# Altium footprint library MH_DA_THU_VIEN_16122016.PcbLib: 531 footprints (part 6 of 34)
Each footprint in its own frame and in the unit in brackets; x right, y up, seen from the top. Pads: shape width x height; smd on the part's side, far side on the other; paste and mask are expansions set on the pad; w line width, h text height; cw(c..) or ccw(c..) is an arc to the next point about the centre after c.
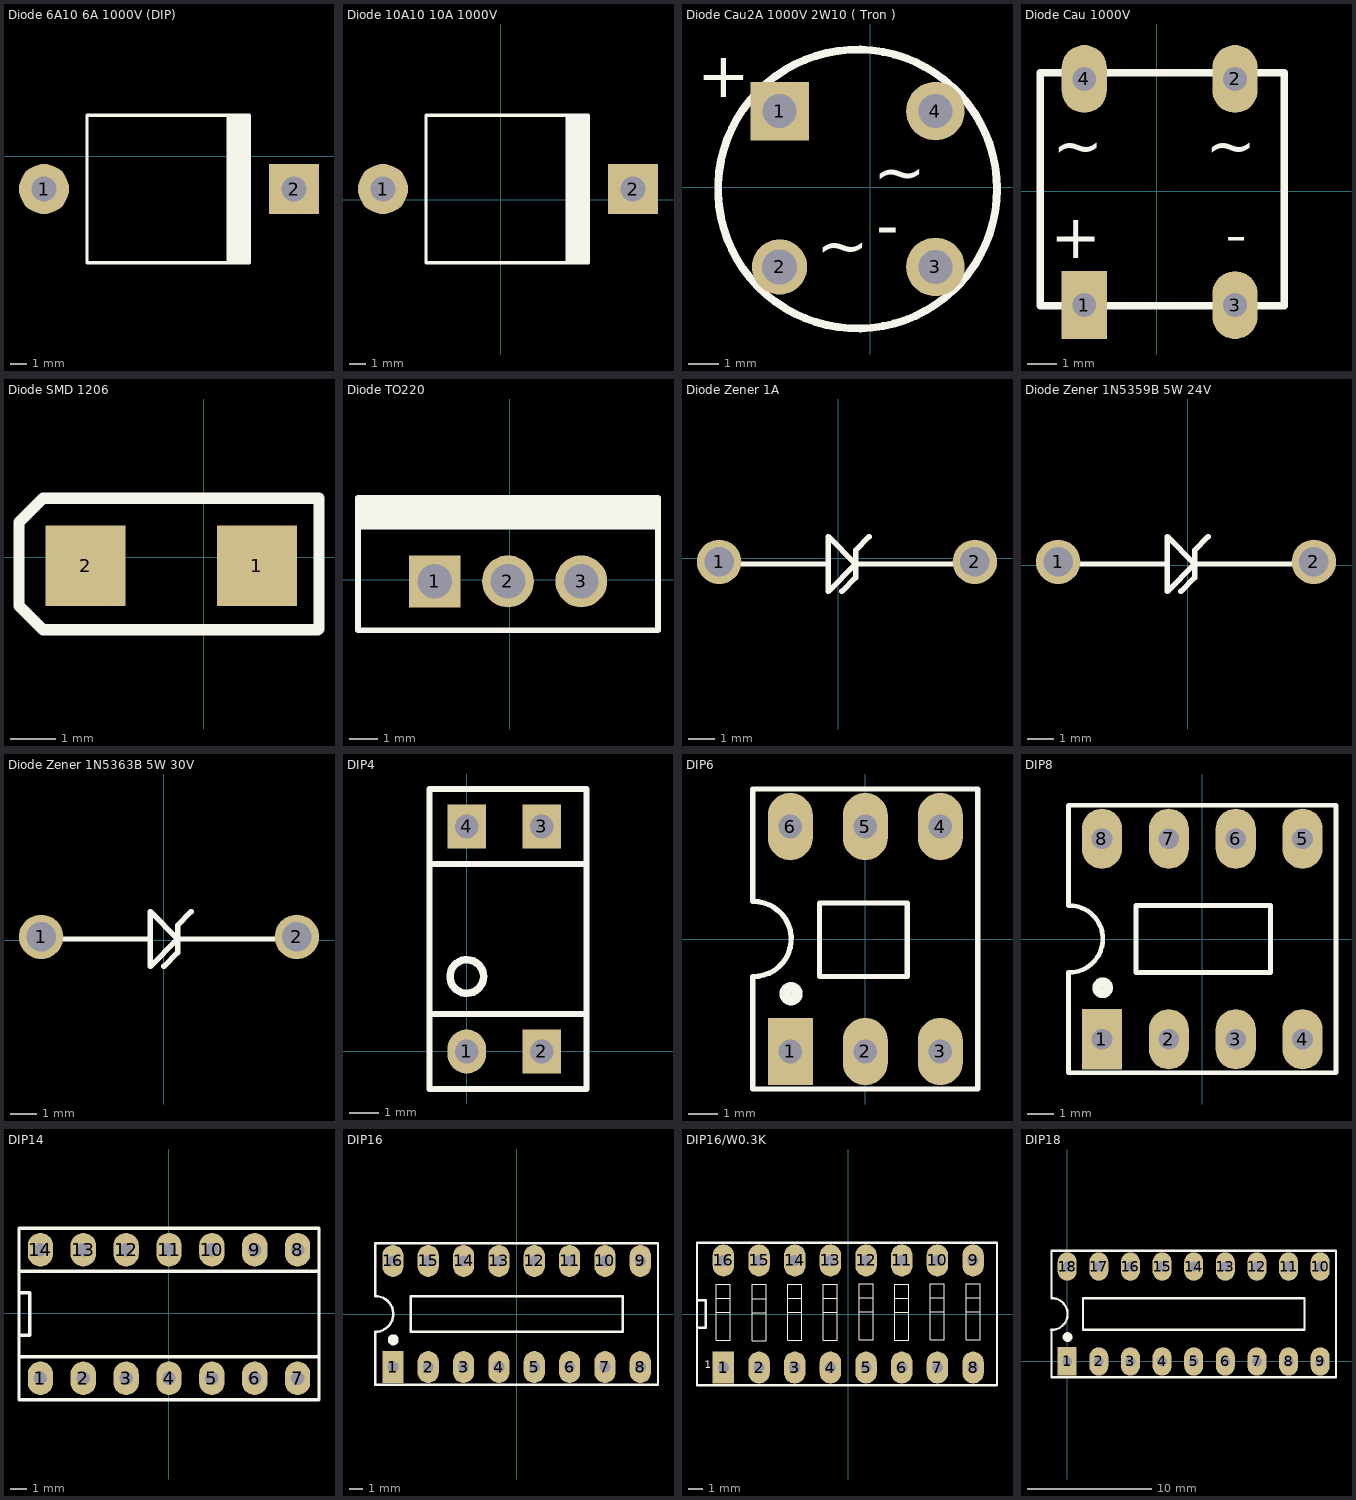
[diagram p5: the footprints below, top view; thin cyan lines are the x and y axes]

## Diode 6A10 6A 1000V (DIP) [mil]
pads (2):
  round 120 hole 60: 1(252.2,-79.02)
  rect 120x120 hole 60: 2(852.2,-79.02)
Top Overlay:
  rectangle: 690,-256.18 749.06,98.15
  lines w7.87: 745.2,-256.18 355.35,-256.18 355.35,98.15 745.2,98.15
3D body: height 179.53, standoff -399.61, extent 229.41,-264.52 880.59,94.53

## Diode 10A10 10A 1000V [mil]
pads (2):
  round 120 hole 60: 1(-282.8,25.98)
  rect 120x120 hole 60: 2(317.2,25.98)
Top Overlay:
  rectangle: 155,-151.18 214.06,203.15
  lines w7.87: 210.2,-151.18 -179.65,-151.18 -179.65,203.15 210.2,203.15
3D body: height 179.53, standoff -399.61, extent -310.6,-154.53 340.58,204.53

## Diode Cau2A 1000V 2W10 ( Tron ) [mm]
pads (4):
  rect 1.905x1.905 hole 1.1: 1(-2.952,2.477)
  round 1.8 hole 1.143: 2(-2.952,-2.603)
  round 1.905 hole 1.1: 3(2.128,-2.603) 4(2.128,2.477)
Top Overlay:
  circle w0.254: c-0.412,-0.063 r4.547
  text "+" at -5.644,2.934 h1.5
  text "-" at 0.198,-1.968 h1.5
  text "~" at -1.758,-2.628 h1.5
  text "~" at 0.096,-0.241 h1.5

## Diode Cau 1000V [mil]
pads (4):
  rect 60x90 hole 31.5: 1(-96.44,-151.02)
  oval 60x90 hole 31.5: 2(103.56,148.98) 3(103.56,-151.02) 4(-96.44,148.98)
Top Overlay:
  lines w10: -155,-151.98 -155,157.02 169,157.02 169,-151.98 -155,-151.98
  text "-" at 120,-23.98 h100
  text "+" at -74,-18.98 h100
  text "~" at -71,102.02 h100
  text "~" at 132,102.02 h100
3D body: height 146, standoff -122.11, extent -158.28,-154.92 164.56,156.89

## Diode SMD 1206 [mil]
pads (2):
  rect 70x70 smd: 1(46.38,-7.48) 2(-103.23,-7.48)
Top Overlay:
  lines w10: -161.43,-42.48 -140.43,-63.48 -139.43,-63.48 99.57,-63.48 100.57,-62.48 100.57,51.52 -134.43,51.52 -140.43,51.52 -161.43,30.52 -161.43,-42.48
3D body: height 62.99, standoff 0, extent -101.26,-41.48 44.41,21.52

## Diode TO220 [mm]
pads (3):
  rect 1.8x1.8 hole 1.2: 1(-2.595,-0.047)
  round 1.8 hole 1.2: 2(-0.055,-0.047) 3(2.485,-0.047)
Top Overlay:
  rectangle: -5.255,1.845 5.145,2.853
  lines w0.2: -5.255,1.845 5.145,1.845 ; -5.255,-1.747 5.145,-1.747 5.145,2.853 -5.255,2.853 -5.255,-1.747
3D body: height 8.08, standoff -20.7, extent -4.94,-1.919 4.96,2.581

## Diode Zener 1A [mil]
pads (2):
  round 65 hole 43.31: 1(-175,-5) 2(200,-5)
Top Overlay:
  lines w8: -170,-8.11 -14.96,-8.11 ; 5.04,-48.11 25.04,-28.11 25.04,-8.11 ; 45.04,31.89 25.04,11.89 25.04,-8.11 ; 190,-8.11 25.04,-8.11 ; 25.04,-8.11 -14.96,31.89 -14.96,-48.11 25.04,-8.11
3D body: height 84.5, standoff -100, extent -195.49,-39 225.49,30

## Diode Zener 1N5359B 5W 24V [mil]
pads (2):
  round 65 hole 43.31: 1(-190,5) 2(185,5)
Top Overlay:
  lines w8: -185,1.89 -29.96,1.89 ; -9.96,-38.11 10.04,-18.11 10.04,1.89 ; 30.04,41.89 10.04,21.89 10.04,1.89 ; 175,1.89 10.04,1.89 ; 10.04,1.89 -29.96,41.89 -29.96,-38.11 10.04,1.89
3D body: height 84.5, standoff -100, extent -210.49,-29 210.49,40

## Diode Zener 1N5363B 5W 30V [mil]
pads (2):
  round 65 hole 43.31: 1(-180,5) 2(195,5)
Top Overlay:
  lines w8: -175,1.89 -19.96,1.89 ; 0.04,-38.11 20.04,-18.11 20.04,1.89 ; 40.04,41.89 20.04,21.89 20.04,1.89 ; 185,1.89 20.04,1.89 ; 20.04,1.89 -19.96,-38.11 -19.96,41.89 20.04,1.89
3D body: height 84.5, standoff -100, extent -200.49,-29 220.49,40

## DIP4 [mm] "W.300/L.400"
height 5.59
pads (4):
  oval 1.3x1.5 hole 0.8: 1(0,0)
  rect 1.3x1.5 hole 0.8: 2(2.54,0) 3(2.54,7.62) 4(0,7.62)
Top Overlay:
  circle w0.254: c0,2.54 r0.568
  lines w0.203: -1.27,1.27 4.064,1.27 ; -1.27,1.27 -1.27,6.35 ; -1.27,1.27 4.064,1.27 ; -1.27,1.27 -1.27,6.35 ; -1.27,1.27 -1.27,-1.27 4.064,-1.27 4.064,1.524 4.064,6.35 ; -1.27,1.27 -1.27,2.54 -1.27,5.08 -1.27,8.89 4.064,8.89 4.064,6.35 ; -1.27,6.35 4.064,6.35 ; -1.27,6.35 4.064,6.35 ; 4.064,1.27 4.064,6.35
3D body: height 5, standoff 0.4, extent -1.27,-1.27 4.064,8.89

## DIP6 [mil] "6 PIN, W 300mil, Pin to pin 100mil"
height 100
pads (6):
  rect 60x90 hole 31.5: 1(-100,-150)
  oval 60x90 hole 31.5: 2(0,-150) 3(100,-150) 4(100,150) 5(0,150) 6(-100,150)
Top Overlay:
  circle w15: c-99,-73 r8
  lines w7: -150.38,-49.95 ccw(c-148.69,0.02) -150,50 ; -150,-50 -150,-200 150,-200 150,200 -150,200 -150,51 ; -61,-50 -61,48 56,48 56,-50 -61,-50
3D body: height 169.69, standoff -129.13, extent -158.11,-157.48 160,157.48

## DIP8 [mil]
pads (8):
  rect 60x90 hole 31: 1(-150,-150)
  oval 60x90 hole 31: 2(-50,-150) 3(50,-150) 4(150,-150) 5(150,150) 6(50,150) 7(-50,150) 8(-150,150)
Top Overlay:
  circle w15: c-149,-73 r8
  lines w7: -200.38,-49.95 ccw(c-198.69,0.02) -200,50 ; -200,-50 -200,-200 200,-200 200,200 -200,200 -200,51 ; -99,-50 102,-50 102,50 -99,50 -99,-50
3D body: height 201.25, standoff -129.47, extent -200,-190 200,186.4

## DIP14 [mm]
pads (14):
  oval 1.5x2 hole 0.8: 1(-7.595,-3.861) 2(-5.055,-3.861) 3(-2.515,-3.861) 4(0.025,-3.861) 5(2.565,-3.861) 6(5.105,-3.861) 7(7.645,-3.861) 8(7.645,3.759) 9(5.105,3.759) 10(2.565,3.759) 11(0.025,3.759) 12(-2.515,3.759) 13(-5.055,3.759) 14(-7.595,3.759)
Top Overlay:
  lines w0.203: -8.865,-2.591 -8.865,-1.321 ; -8.865,-2.591 -8.865,-1.321 ; -8.865,-2.591 8.915,-2.591 ; -8.865,-2.591 8.915,-2.591 ; -8.865,-1.321 -8.23,-1.321 ; -8.865,-1.321 -8.865,1.219 ; -8.865,-1.321 -8.23,-1.321 ; -8.865,-1.321 -8.865,1.219 ; -8.865,1.219 -8.23,1.219 ; -8.865,1.219 -8.865,2.489 ; -8.865,1.219 -8.23,1.219 ; -8.865,1.219 -8.865,2.489 ; -8.865,2.489 8.915,2.489 ; -8.865,2.489 8.915,2.489 ; -8.23,-1.321 -8.23,1.219 ; -8.23,-1.321 -8.23,1.219 ; 8.915,-2.591 8.915,2.489 ; -8.865,-5.131 8.915,-5.131 8.915,5.029 -8.865,5.029 -8.865,-5.131
3D body: height 4.5, standoff -3.5, extent -9.024,-3.931 9.076,3.83

## DIP16 [mil] "16 PIN, W 300mil, Pin to pin 100mil"
height 100
pads (16):
  rect 60x90 hole 31: 1(-350,-150)
  oval 60x90 hole 31: 2(-250,-150) 3(-150,-150) 4(-50,-150) 5(50,-150) 6(150,-150) 7(250,-150) 8(350,-150) 9(350,150) 10(250,150) 11(150,150) 12(50,150) 13(-50,150) 14(-150,150) 15(-250,150) 16(-350,150)
Top Overlay:
  circle w15: c-349,-73 r8
  lines w7: -400.38,-49.95 ccw(c-398.69,0.02) -400,50 ; -400,-50 -400,-200 400,-200 400,200 -399,200 -400,199 ; -400,51 -400,200 ; -300,-50 300,-50 300,50 -300,50 -300,-50
3D body: height 299.42, standoff -131.12, extent -401.7,-207.39 401.7,206

## DIP16/W0.3K [mil] "16 PIN, W 300mil, Pin to pin 100mil For Switch"
height 100
pads (16):
  rect 60x90 hole 31.5: 1(-350,-150)
  oval 60x90 hole 31.5: 2(-250,-150) 3(-150,-150) 4(-50,-150) 5(50,-150) 6(150,-150) 7(250,-150) 8(350,-150) 9(350,150) 10(250,150) 11(150,150) 12(50,150) 13(-50,150) 14(-150,150) 15(-250,150) 16(-350,150)
Top Overlay:
  lines w1.5: -369.69,5 -330.31,5 ; -369.69,44.37 -330.31,44.37 ; -269.69,4 -230.31,4 ; -269.69,43.37 -230.31,43.37 ; -169.69,5 -130.31,5 ; -169.69,44.37 -130.31,44.37 ; -69.69,5 -30.32,5 ; -69.69,44.37 -30.32,44.37 ; 30.32,6 69.69,6 ; 30.32,45.37 69.69,45.37 ; 130.31,5 169.69,5 ; 130.31,44.37 169.69,44.37 ; 230.31,6 269.69,6 ; 230.31,45.37 269.69,45.37 ; 330.31,6 369.69,6 ; 330.31,45.37 369.69,45.37 ; -369.69,-73.74 -369.69,83.74 -330.31,83.74 -330.31,-73.74 -369.69,-73.74 ; -269.69,-74.74 -269.69,82.74 -230.31,82.74 -230.31,-74.74 -269.69,-74.74 ; -169.69,-73.74 -169.69,83.74 -130.31,83.74 -130.31,-73.74 -169.69,-73.74 ; -69.69,-73.74 -69.69,83.74 -30.32,83.74 -30.32,-73.74 -69.69,-73.74 ; 30.32,-72.74 30.32,84.74 69.69,84.74 69.69,-72.74 30.32,-72.74 ; 130.31,-73.74 130.31,83.74 169.69,83.74 169.69,-73.74 130.31,-73.74 ; 230.31,-72.74 230.31,84.74 269.69,84.74 269.69,-72.74 230.31,-72.74 ; 330.31,-72.74 330.31,84.74 369.69,84.74 369.69,-72.74 330.31,-72.74
  lines w7: -424,-80.5 -424,84 ; -424,-39 -399,-39 -399,39 -423,39 -424,40 ; -424,-25 -424,-199 -423,-200 417,-200 417,200 -424,200 -424,25
  text "1" at -402,-152 h20
3D body: height 324.8, standoff -137.8, extent -442.91,-190 442.91,195.04

## DIP18 [mil] "18 PIN, W 300mil, Pin to pin 100mil"
height 100
pads (18):
  rect 60x90 hole 31: 1(0,0)
  oval 60x90 hole 31: 2(100,0) 3(200,0) 4(300,0) 5(400,0) 6(500,0) 7(600,0) 8(700,0) 9(800,0) 10(800,300) 11(700,300) 12(600,300) 13(500,300) 14(400,300) 15(300,300) 16(200,300) 17(100,300) 18(0,300)
Top Overlay:
  circle w15: c1,77 r8
  lines w7: -50.38,100.05 ccw(c-48.69,150.02) -50,200 ; -50,100 -50,-50 850,-50 850,350 -50,350 -50,201 ; 50,100 50,200 750,200 750,100 50,100
3D body: height 118.71, standoff -131.12, extent -51.18,-57.39 849.18,356